# Altium footprint library pinghengche.PcbLib: 128 footprints (part 7 of 8)
Each footprint in its own frame and in the unit in brackets; x right, y up, seen from the top. Pads: shape width x height; smd on the part's side, far side on the other; paste and mask are expansions set on the pad; w line width, h text height; cw(c..) or ccw(c..) is an arc to the next point about the centre after c.
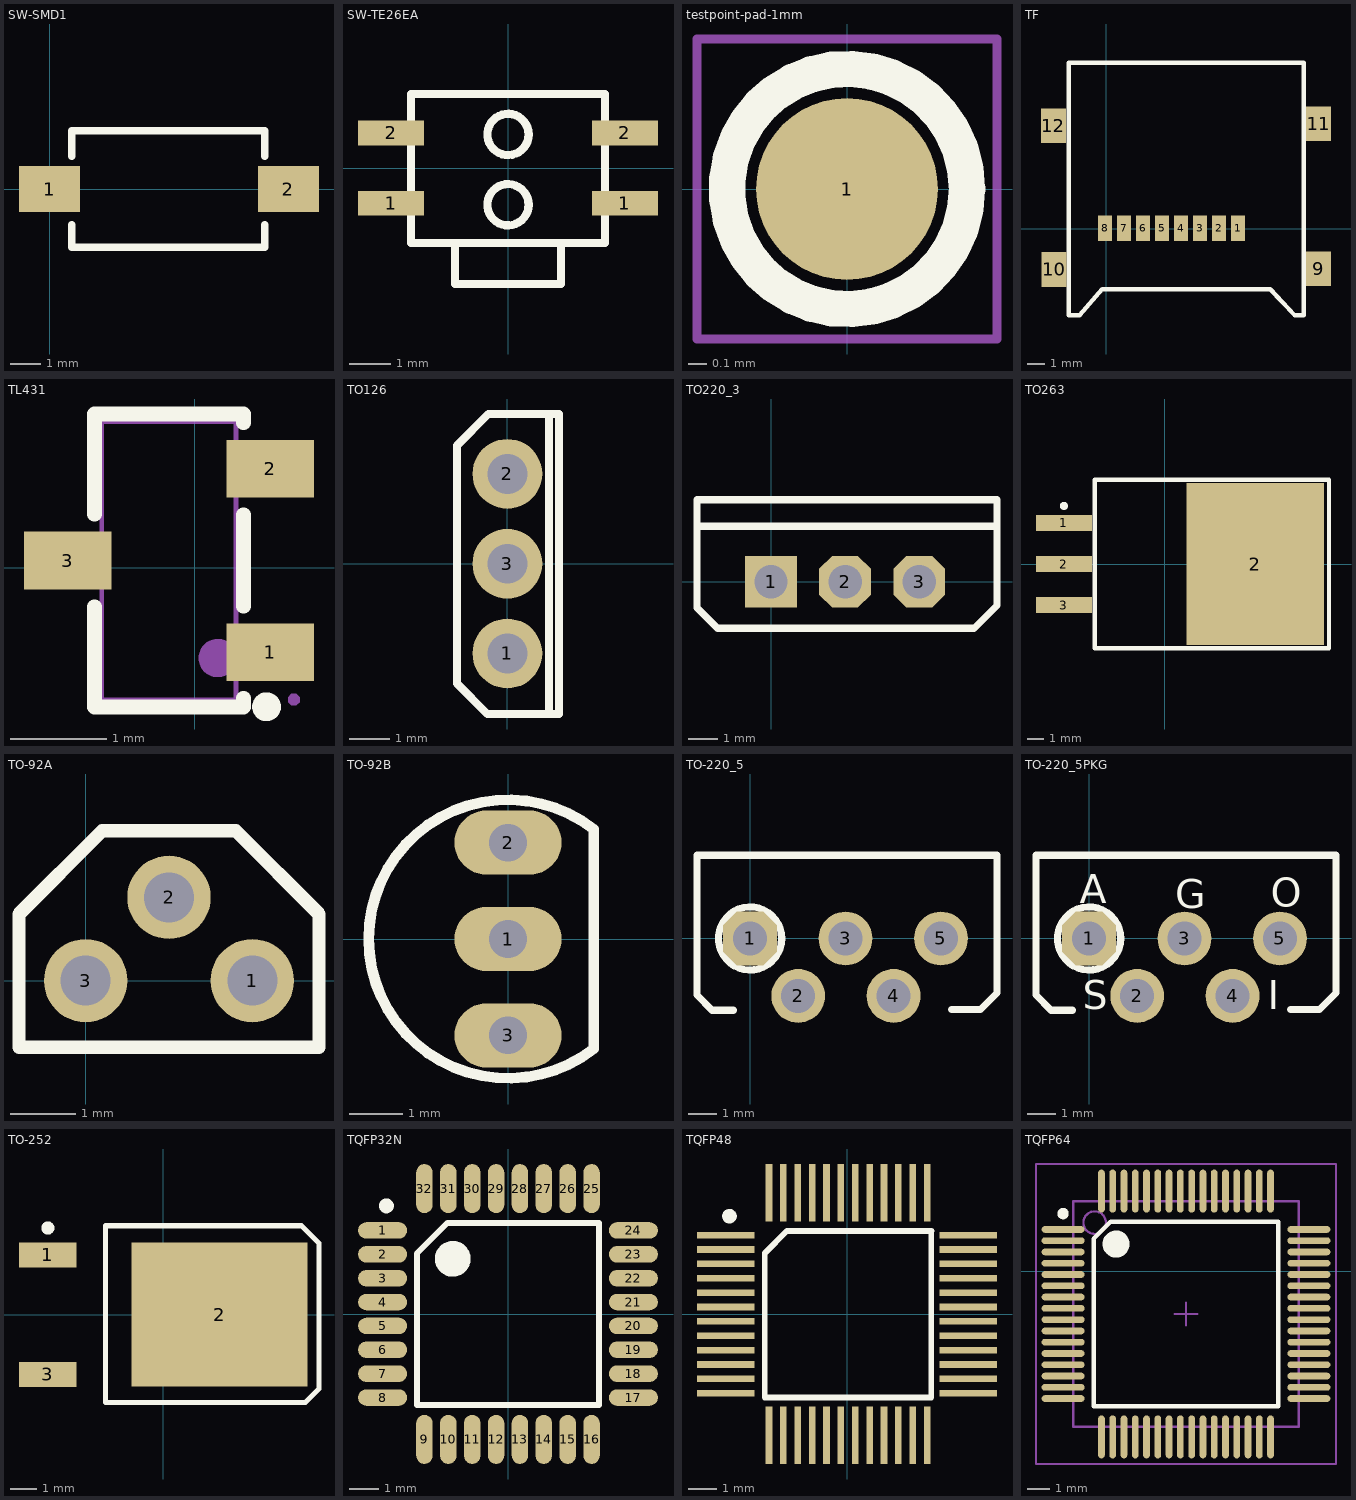
[diagram p6: the footprints below, top view; thin cyan lines are the x and y axes]

## SW-SMD1 [mm]
pads (2):
  rect 2x1.5 smd: 1(0,0) 2(7.8,0)
Top Overlay:
  lines w0.254: 0.725,-1.168 0.725,-1.9 7.025,-1.9 7.025,-1.168 ; 0.725,1.067 0.725,1.9 7.025,1.9 7.025,1.067
3D body "SMD按键.STEP": height 2.5, standoff 0, extent -0.059,-1.945 7.831,1.905

## SW-TE26EA [mm]
pads (4):
  rect 1.6x0.6 smd: 1(-2.832,-0.851) 1(2.832,-0.851) 2(-2.832,0.851) 2(2.832,0.851)
Top Overlay:
  circle w0.2: c0,-0.889 r0.5
  circle w0.2: c0,0.813 r0.5
  lines w0.2: -1.283,-1.836 -1.283,-2.807 1.283,-2.807 1.283,-1.836 ; -2.349,-1.816 2.349,-1.816 2.349,1.791 -2.349,1.791 -2.349,-1.816
3D body "零": height 1.63, standoff -0.02, extent -2.941,-2.807 2.959,1.693

## testpoint-pad-1mm [mm]
height 2
pads (1):
  round 1 smd: 1(0,0)
Top Overlay:
  circle w0.2: c0,0 r0.66
Top Component Outline:
  lines w0.05: -0.825,-0.825 -0.825,0.825 0.825,0.825 0.825,-0.825 -0.825,-0.825
Top Designator:
  text ".Designator" at -2.252,-0.226 h1

## TF [mm]
pads (12):
  rect 0.8x1.5 smd: 1(7.624,0.025) 2(6.524,0.025) 3(5.424,0.025) 4(4.324,0.025) 5(3.224,0.025) 6(2.124,0.025) 7(1.024,0.025) 8(-0.076,0.025)
  rect 1.45x2 smd: 9(12.294,-2.311) 10(-3.023,-2.362) 11(12.294,6.071) 12(-3.073,5.969)
Top Overlay:
  lines w0.254: -2.174,-5.002 -2.174,9.598 11.426,9.598 11.426,-5.002 10.895,-5.002 9.496,-3.502 -0.244,-3.502 -1.551,-5.002 -2.174,-5.002
3D body "MICROSD.step": height 1.93, standoff -0.02, extent -2.713,-4.837 11.887,9.663

## TL431 [mm]
pads (3):
  rect 0.91x0.6 smd mask+0.051: 1(0.787,-0.88) 2(0.787,1.03) 3(-1.323,0.075)
Top Overlay:
  circle w0.15: c0.748,-1.449 r0.075
  lines w0.152: -1.044,-0.405 -1.044,-1.451 0.508,-1.451 0.508,-1.36 ; -1.044,0.555 -1.044,1.601 0.508,1.601 0.508,1.51 ; 0.508,-0.4 0.508,0.55
Mechanical 6:
  circle w0.2: c0.24,-0.941 r0.1
Mechanical 15:
  region: -1.228,0.3 -0.958,0.3 -0.958,-0.15 -1.228,-0.15
  region: -1.568,0.3 -1.218,0.3 -1.218,-0.15 -1.568,-0.15
  region: 0.692,1.255 0.422,1.255 0.422,0.805 0.692,0.805
  region: 1.032,1.255 0.682,1.255 0.682,0.805 1.032,0.805
  region: 0.692,-0.655 0.422,-0.655 0.422,-1.105 0.692,-1.105
  region: 1.032,-0.655 0.682,-0.655 0.682,-1.105 1.032,-1.105
  region: 1.092,-1.375 1.092,-1.35 1.057,-1.315 1.007,-1.315 0.972,-1.35 0.972,-1.375 0.972,-1.4 1.007,-1.435 1.057,-1.435 1.092,-1.4
  lines w0.051: -0.968,-1.375 0.432,-1.375 0.432,1.525 -0.968,1.525 -0.968,-1.375

## TO126 [mm] "BD135"
pads (3):
  round 1.75 hole 1: 1(0,-2.25) 2(0,2.25) 3(0,0)
Top Overlay:
  lines w0.2: 1.041,-3.734 1.041,3.734 ; -1.268,-3.005 -1.268,2.964 -0.48,3.752 1.295,3.752 1.295,-3.767 -0.506,-3.767 -1.268,-3.005
3D body "BD135 (TO-126 SOT32) v4.step": height 14.6, standoff -3.35, extent -1.797,-3.934 0.903,3.866

## TO220_3 [mil]
pads (3):
  rect 70x70 hole 45: 1(0,0)
  oct 70x70 hole 45: 2(100,0) 3(200,0)
Top Overlay:
  lines w10: -94,75 302,75 ; -100,-35 -72,-63 274,-63 305,-32 305,111 -100,111 -100,-35
3D body "TO220_3.STEP": height 728.35, standoff -389.76, extent -104.45,-72.17 305,105

## TO263 [mm] "D2PAK936"
height 4.5
pads (4):
  rect 3.45x1 smd: 1(-6.225,2.54) 2(-6.225,0) 3(-6.225,-2.54)
  rect 8.5x10 smd: 2(5.588,0)
Top Overlay:
  circle w0.25: c-6.225,3.59 r0.125
  lines w0.254: -4.318,-5.207 10.16,-5.207 10.16,5.207 -4.318,5.207 -4.318,-5.207
3D body "SW3dPS-TO263-3.STEP": height 4.88, standoff 0.08, extent -6.819,-5.054 8.851,4.946

## TO-92A [mil] "7805/7809/LP2950电源芯片（未加焊）"
pads (3):
  round 50 hole 30: 1(100,0) 2(50,50) 3(0,0)
Top Overlay:
  lines w8: -40,-40 -40,40 10,90 90,90 140,40 140,-40 -40,-40
3D body "micromsd_n.stp": height 269.29, standoff -118.11, extent -39.17,-37.8 138.78,96.06

## TO-92B [mm] "TO, Flat Index; 3 In-Line, Axial Leads; Body Dia. 4.8mm; Leads 0.48 x 0.5 mm (max)"
height 5.33
pads (3):
  oval 2x1.2 hole 0.7: 1(0,0) 2(0,1.8) 3(0,-1.8)
Top Overlay:
  lines w0.2: 1.601,-2.049 cw(c0,0) 1.601,2.049 ; 1.6,-1.99 1.6,1.99
3D body: height 8, standoff 3, extent -2.6,-2.59 1.65,2.59
3D body: height 3, standoff 0, extent -0.246,1.583 0.254,2.023
3D body: height 3, standoff 0, extent -0.25,-0.22 0.25,0.22
3D body: height 3, standoff 0, extent -0.25,-2.04 0.25,-1.6

## TO-220_5 [mm]
pads (5):
  oct 1.905x1.905 hole 1.2: 1(0,0)
  round 1.905 hole 1.2: 2(1.702,-2.032) 3(3.378,0) 4(5.08,-2.032) 5(6.756,0)
Top Overlay:
  circle w0.254: c0,0 r1.118
  lines w0.254: -0.584,-2.54 -1.346,-2.54 -1.88,-2.006 -1.88,1.34 -1.88,2.946 8.74,2.946 8.74,1.432 8.74,-1.928 8.151,-2.517 7.135,-2.517
3D body "TO220-5.STEP": height 19.35, standoff -2.26, extent -1.68,-2.1 8.48,2.8

## TO-220_5PKG [mm]
pads (5):
  oct 1.905x1.905 hole 1.2: 1(0,0)
  round 1.905 hole 1.2: 2(1.702,-2.032) 3(3.378,0) 4(5.08,-2.032) 5(6.756,0)
Top Overlay:
  circle w0.254: c0,0 r1.118
  lines w0.254: -0.584,-2.54 -1.346,-2.54 -1.88,-2.006 -1.88,1.34 -1.88,2.946 8.74,2.946 8.74,1.432 8.74,-1.928 8.151,-2.517 7.135,-2.517
  text "A" at -0.33,1.245 h1.02
  text "S" at -0.229,-2.515 h1.02
  text "I" at 6.325,-2.515 h1.02
  text "G" at 3.048,1.067 h1.02
  text "O" at 6.426,1.118 h1.02
3D body "TO220-5.STEP": height 19.35, standoff -2.26, extent -1.68,-2.1 8.48,2.8

## TO-252 [mm] "D-PAK  / SOT-428"
height 2.38
pads (3):
  rect 2.2x0.95 smd: 1(-4.4,2.28) 3(-4.4,-2.28)
  rect 6.7x5.5 smd: 2(2.15,0)
Top Overlay:
  circle w0.25: c-4.4,3.305 r0.125
  lines w0.1: -2.2,-3.35 -2.2,3.35
  lines w0.2: -2.2,-3.35 5.418,-3.35 5.944,-2.824 5.944,2.725 5.278,3.391 -2.2,3.391 -2.2,-3.35
3D body "D-PAK.STEP": height 2.31, standoff 0, extent -4.475,-3.3 4.775,3.3

## TQFP32N [mm] "TQFP, 32-Leads, Body 9.0x9.0mm (max), Pitch 0.80mm, IPC Medium Density"
height 1.2
pads (32):
  oval 1.65x0.55 smd: 1(-4.202,2.8) 2(-4.202,2) 3(-4.202,1.2) 4(-4.202,0.4) 5(-4.202,-0.4) 6(-4.202,-1.2) 7(-4.202,-2) 8(-4.202,-2.8) 17(4.202,-2.8) 18(4.202,-2) 19(4.202,-1.2) 20(4.202,-0.4) 21(4.202,0.4) 22(4.202,1.2) 23(4.202,2) 24(4.202,2.8)
  oval 0.55x1.65 smd: 9(-2.8,-4.202) 10(-2,-4.202) 11(-1.2,-4.202) 12(-0.4,-4.202) 13(0.4,-4.202) 14(1.2,-4.202) 15(2,-4.202) 16(2.8,-4.202) 25(2.8,4.202) 26(2,4.202) 27(1.2,4.202) 28(0.4,4.202) 29(-0.4,4.202) 30(-1.2,4.202) 31(-2,4.202) 32(-2.8,4.202)
Top Overlay:
  circle w0.6: c-1.85,1.85 r0.3
  circle w0.25: c-4.075,3.625 r0.125
  lines w0.2: -3.048,-3.048 -3.048,2.032 -2.032,3.048 3.048,3.048 3.048,-3.048 -3.048,-3.048
3D body "User Library-TQFP32-1.step": height 1.1, standoff 0, extent -4.509,-4.483 4.509,4.534

## TQFP48 [mm]
pads (48):
  rect 2x0.23 smd: 1(-4.22,2.743) 2(-4.22,2.243) 3(-4.22,1.743) 4(-4.22,1.243) 5(-4.22,0.743) 6(-4.22,0.243) 7(-4.22,-0.257) 8(-4.22,-0.757) 9(-4.22,-1.257) 10(-4.22,-1.757) 11(-4.22,-2.257) 12(-4.22,-2.757) 25(4.22,-2.757) 26(4.22,-2.257) 27(4.22,-1.757) 28(4.22,-1.257) 29(4.22,-0.757) 30(4.22,-0.257) 31(4.22,0.243) 32(4.22,0.743) 33(4.22,1.243) 34(4.22,1.743) 35(4.22,2.243) 36(4.22,2.743)
  rect 0.23x2 smd: 13(-2.714,-4.22) 14(-2.214,-4.22) 15(-1.714,-4.22) 16(-1.214,-4.22) 17(-0.714,-4.22) 18(-0.214,-4.22) 19(0.286,-4.22) 20(0.786,-4.22) 21(1.286,-4.22) 22(1.786,-4.22) 23(2.286,-4.22) 24(2.786,-4.22) 37(2.786,4.22) 38(2.286,4.22) 39(1.786,4.22) 40(1.286,4.22) 41(0.786,4.22) 42(0.286,4.22) 43(-0.214,4.22) 44(-0.714,4.22) 45(-1.214,4.22) 46(-1.714,4.22) 47(-2.214,4.22) 48(-2.714,4.22)
Top Overlay:
  circle w0.254: c-4.089,3.404 r0.127
  lines w0.2: -2.864,-2.907 2.936,-2.907 2.936,2.893
  lines w0.203: -2.864,-2.907 -2.864,2.114 -2.085,2.893 2.936,2.893
3D body "TQFP48.STEP": height 1.1, standoff 0, extent -4.483,-4.509 4.534,4.509

## TQFP64 [mm]
pads (64):
  oval 1.9x0.3 smd: 1(32.904,1.845) 2(32.904,1.345) 3(32.904,0.845) 4(32.904,0.345) 5(32.904,-0.155) 6(32.904,-0.655) 7(32.904,-1.155) 8(32.904,-1.655) 9(32.904,-2.155) 10(32.904,-2.655) 11(32.904,-3.155) 12(32.904,-3.655) 13(32.904,-4.155) 14(32.904,-4.655) 15(32.904,-5.155) 16(32.904,-5.655) 33(43.804,-5.655) 34(43.804,-5.155) 35(43.804,-4.655) 36(43.804,-4.155) 37(43.804,-3.655) 38(43.804,-3.155) 39(43.804,-2.655) 40(43.804,-2.155) 41(43.804,-1.655) 42(43.804,-1.155) 43(43.804,-0.655) 44(43.804,-0.155) 45(43.804,0.345) 46(43.804,0.845) 47(43.804,1.345) 48(43.804,1.845)
  oval 0.3x1.9 smd: 17(34.604,-7.355) 18(35.104,-7.355) 19(35.604,-7.355) 20(36.104,-7.355) 21(36.604,-7.355) 22(37.104,-7.355) 23(37.604,-7.355) 24(38.104,-7.355) 25(38.604,-7.355) 26(39.104,-7.355) 27(39.604,-7.355) 28(40.104,-7.355) 29(40.604,-7.355) 30(41.104,-7.355) 31(41.604,-7.355) 32(42.104,-7.355) 49(42.104,3.545) 50(41.604,3.545) 51(41.104,3.545) 52(40.604,3.545) 53(40.104,3.545) 54(39.604,3.545) 55(39.104,3.545) 56(38.604,3.545) 57(38.104,3.545) 58(37.604,3.545) 59(37.104,3.545) 60(36.604,3.545) 61(36.104,3.545) 62(35.604,3.545) 63(35.104,3.545) 64(34.604,3.545)
Top Overlay:
  circle w0.6: c35.254,1.195 r0.3
  circle w0.25: c32.904,2.545 r0.125
  lines w0.2: 34.254,-6.005 42.454,-6.005 42.454,2.195 35.012,2.195 34.254,1.437 34.254,-6.005
Mechanical 13:
  circle w0.1: c34.304,2.145 r0.5
  lines w0.1: 33.354,-6.905 43.354,-6.905 43.354,3.095 33.354,3.095 33.354,-6.905
Mechanical 15:
  lines w0.1: 37.854,-1.905 38.854,-1.905 ; 38.354,-2.405 38.354,-1.405 ; 31.704,-8.555 45.004,-8.555 45.004,4.745 31.704,4.745 31.704,-8.555
3D body "TQFP64_1.STEP": height 1, standoff -0.06, extent 32.354,-7.911 44.354,4.089